# Altium footprint library andylib.PcbLib: 158 footprints (part 9 of 10)
Each footprint in its own frame and in the unit in brackets; x right, y up, seen from the top. Pads: shape width x height; smd on the part's side, far side on the other; paste and mask are expansions set on the pad; w line width, h text height; cw(c..) or ccw(c..) is an arc to the next point about the centre after c.
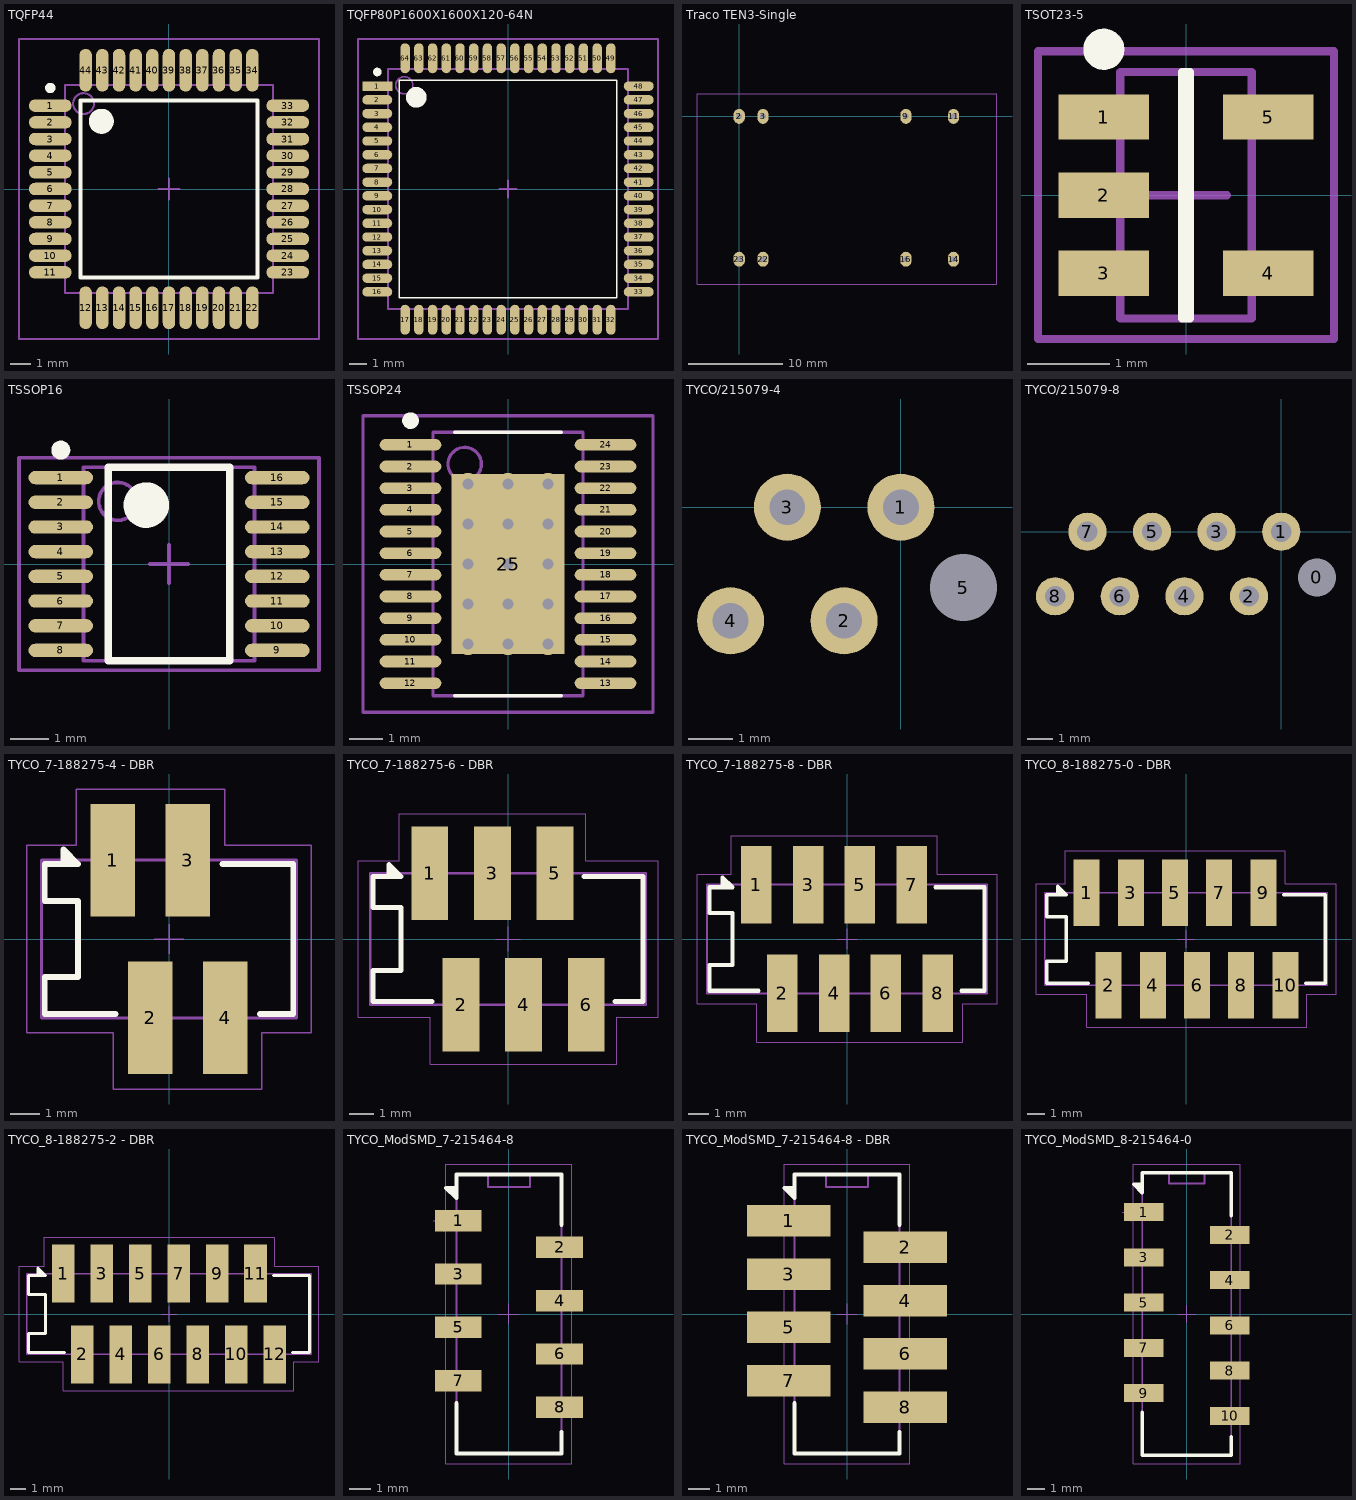
[diagram p8: the footprints below, top view; thin cyan lines are the x and y axes]

## TQFP44 [mm]
pads (44):
  oval 2.05x0.6 smd: 1(-5.7,4) 2(-5.7,3.2) 3(-5.7,2.4) 4(-5.7,1.6) 5(-5.7,0.8) 6(-5.7,0) 7(-5.7,-0.8) 8(-5.7,-1.6) 9(-5.7,-2.4) 10(-5.7,-3.2) 11(-5.7,-4) 23(5.7,-4) 24(5.7,-3.2) 25(5.7,-2.4) 26(5.7,-1.6) 27(5.7,-0.8) 28(5.7,0) 29(5.7,0.8) 30(5.7,1.6) 31(5.7,2.4) 32(5.7,3.2) 33(5.7,4)
  oval 0.6x2.05 smd: 12(-4,-5.7) 13(-3.2,-5.7) 14(-2.4,-5.7) 15(-1.6,-5.7) 16(-0.8,-5.7) 17(0,-5.7) 18(0.8,-5.7) 19(1.6,-5.7) 20(2.4,-5.7) 21(3.2,-5.7) 22(4,-5.7) 34(4,5.7) 35(3.2,5.7) 36(2.4,5.7) 37(1.6,5.7) 38(0.8,5.7) 39(0,5.7) 40(-0.8,5.7) 41(-1.6,5.7) 42(-2.4,5.7) 43(-3.2,5.7) 44(-4,5.7)
Top Overlay:
  circle w0.6: c-3.25,3.25 r0.3
  circle w0.25: c-5.7,4.85 r0.125
  lines w0.2: -4.25,-4.25 4.25,-4.25 4.25,4.25 -4.25,4.25 -4.25,-4.25
Mechanical 13:
  circle w0.1: c-4.1,4.1 r0.5
  lines w0.1: -5,-5 5,-5 5,5 -5,5 -5,-5
Mechanical 15:
  lines w0.1: -0.5,0 0.5,0 ; 0,-0.5 0,0.5 ; -7.2,-7.2 7.2,-7.2 7.2,7.2 -7.2,7.2 -7.2,-7.2
3D body: height 1.11, standoff 0, extent -6.031,-6 5.969,6

## TQFP80P1600X1600X120-64N [mm] "TQFP, 64-Leads, Body 16.3x16.3mm (max), Pitch 0.80mm, IPC Medium Density"
height 1.2
pads (64):
  rect 1.75x0.55 smd: 1(-7.625,6)
  oval 1.75x0.55 smd: 2(-7.625,5.2) 3(-7.625,4.4) 4(-7.625,3.6) 5(-7.625,2.8) 6(-7.625,2) 7(-7.625,1.2) 8(-7.625,0.4) 9(-7.625,-0.4) 10(-7.625,-1.2) 11(-7.625,-2) 12(-7.625,-2.8) 13(-7.625,-3.6) 14(-7.625,-4.4) 15(-7.625,-5.2) 16(-7.625,-6) 33(7.625,-6) 34(7.625,-5.2) 35(7.625,-4.4) 36(7.625,-3.6) 37(7.625,-2.8) 38(7.625,-2) 39(7.625,-1.2) 40(7.625,-0.4) 41(7.625,0.4) 42(7.625,1.2) 43(7.625,2) 44(7.625,2.8) 45(7.625,3.6) 46(7.625,4.4) 47(7.625,5.2) 48(7.625,6)
  oval 0.55x1.75 smd: 17(-6,-7.625) 18(-5.2,-7.625) 19(-4.4,-7.625) 20(-3.6,-7.625) 21(-2.8,-7.625) 22(-2,-7.625) 23(-1.2,-7.625) 24(-0.4,-7.625) 25(0.4,-7.625) 26(1.2,-7.625) 27(2,-7.625) 28(2.8,-7.625) 29(3.6,-7.625) 30(4.4,-7.625) 31(5.2,-7.625) 32(6,-7.625) 49(6,7.625) 50(5.2,7.625) 51(4.4,7.625) 52(3.6,7.625) 53(2.8,7.625) 54(2,7.625) 55(1.2,7.625) 56(0.4,7.625) 57(-0.4,7.625) 58(-1.2,7.625) 59(-2,7.625) 60(-2.8,7.625) 61(-3.6,7.625) 62(-4.4,7.625) 63(-5.2,7.625) 64(-6,7.625)
Top Overlay:
  circle w0.25: c-7.625,6.825 r0.125
  circle w0.6: c-5.35,5.35 r0.3
  lines w0.1: -6.35,-6.35 -6.35,6.35 6.35,6.35 6.35,-6.35 -6.35,-6.35
Mechanical 13:
  circle w0.1: c-6.05,6.05 r0.5
  lines w0.1: -7,-7 -7,7 7,7 7,-7 -7,-7
Mechanical 15:
  lines w0.1: -0.5,0 0.5,0 ; 0,-0.5 0,0.5 ; -8.75,-8.75 -8.75,8.75 8.75,8.75 8.75,-8.75 -8.75,-8.75
3D body: height 1.11, standoff 0, extent -8,-8 8,8

## Traco TEN3-Single [mm] "Traco TEN3 Single Output DC-DC"
height 10.2
pads (8):
  oval 1.2x1.6 hole 0.6 unplated: 2(0,0) 3(2.54,0) 9(17.78,0) 11(22.86,0) 14(22.86,-15.24) 16(17.78,-15.24) 22(2.54,-15.24) 23(0,-15.24)
Mechanical 13:
  lines w0.1: -4.5,-17.9 27.5,-17.9 27.5,2.4 -4.5,2.4 -4.5,-17.9
3D body: height 10.2, standoff -5, extent -5,-17.8 27,2.5

## TSOT23-5 [mm] "SOT23, 5-Leads, Body 3.0x2.6mm (max), Pitch 0.95mm, IPC Medium Density"
height 1.1
pads (5):
  rect 1.1x0.55 smd: 1(-1,0.95) 2(-1,0) 3(-1,-0.95) 4(1,-0.95) 5(1,0.95)
Top Overlay:
  circle w0.25: c-1,1.775 r0.125
  lines w0.1: -0.05,-1.5 -0.05,1.5 0.05,1.5 0.05,-1.5 -0.05,-1.5
Mechanical 13:
  lines w0.1: -0.8,-1.5 0.8,-1.5 0.8,1.5 -0.8,1.5 -0.8,-1.5
Mechanical 15:
  lines w0.1: -0.5,0 0.5,0 ; 0,-0.5 0,0.5 ; -1.8,-1.75 1.8,-1.75 1.8,1.75 -1.8,1.75 -1.8,-1.75
3D body: height 1.1, standoff 0.05, extent -0.8,-1.5 0.8,1.5
3D body: height 0.86, standoff 0, extent -1.405,-1.476 1.405,1.524

## TSSOP16 [mm] "TSOP, 16-Leads, Body 5x4.4mm, Pitch 0.65mm, IPC Medium Density"
height 1.2
pads (16):
  oval 1.7x0.35 smd: 1(-2.85,2.275) 2(-2.85,1.625) 3(-2.85,0.975) 4(-2.85,0.325) 5(-2.85,-0.325) 6(-2.85,-0.975) 7(-2.85,-1.625) 8(-2.85,-2.275) 9(2.85,-2.275) 10(2.85,-1.625) 11(2.85,-0.975) 12(2.85,-0.325) 13(2.85,0.325) 14(2.85,0.975) 15(2.85,1.625) 16(2.85,2.275)
Top Overlay:
  circle w0.25: c-2.85,3 r0.125
  circle w0.6: c-0.6,1.55 r0.3
  lines w0.2: -1.6,-2.55 -1.6,2.55 1.6,2.55 1.6,-2.55 -1.6,-2.55
Mechanical 13:
  circle w0.1: c-1.35,1.65 r0.5
  lines w0.1: -2.25,-2.55 -2.25,2.55 2.25,2.55 2.25,-2.55 -2.25,-2.55
Mechanical 15:
  lines w0.1: -0.5,0 0.5,0 ; 0,-0.5 0,0.5 ; -3.95,-2.8 -3.95,2.8 3.95,2.8 3.95,-2.8 -3.95,-2.8
3D body: height 1.25, standoff 0, extent -3.253,-2.55 3.203,2.55

## TSSOP24 [mm] "TSOP, 24-Leads, Body 7.9x4.5mm (max), Pitch 0.65mm, IPC Low Density"
height 1.2
pads (25):
  oval 1.85x0.35 smd: 1(-2.925,3.575) 2(-2.925,2.925) 3(-2.925,2.275) 4(-2.925,1.625) 5(-2.925,0.975) 6(-2.925,0.325) 7(-2.925,-0.325) 8(-2.925,-0.975) 9(-2.925,-1.625) 10(-2.925,-2.275) 11(-2.925,-2.925) 12(-2.925,-3.575) 13(2.925,-3.575) 14(2.925,-2.925) 15(2.925,-2.275) 16(2.925,-1.625) 17(2.925,-0.975) 18(2.925,-0.325) 19(2.925,0.325) 20(2.925,0.975) 21(2.925,1.625) 22(2.925,2.275) 23(2.925,2.925) 24(2.925,3.575)
  rect 3.4x5.4 smd: 25(0,0)
via -1.2,2.4 diameter 0.66 hole 0.33
via 0,2.4 diameter 0.66 hole 0.33
via 1.2,2.4 diameter 0.66 hole 0.33
via -1.2,1.2 diameter 0.66 hole 0.33
via 0,1.2 diameter 0.66 hole 0.33
via 1.2,1.2 diameter 0.66 hole 0.33
via -1.2,0 diameter 0.66 hole 0.33
via 0,0 diameter 0.66 hole 0.33
via 1.2,0 diameter 0.66 hole 0.33
via -1.2,-1.2 diameter 0.66 hole 0.33
via 0,-1.2 diameter 0.66 hole 0.33
via 1.2,-1.2 diameter 0.66 hole 0.33
via -1.2,-2.4 diameter 0.66 hole 0.33
via 0,-2.4 diameter 0.66 hole 0.33
via 1.2,-2.4 diameter 0.66 hole 0.33
Top Overlay:
  circle w0.25: c-2.925,4.3 r0.125
  lines w0.1: -1.6,-3.95 1.6,-3.95 ; -1.6,3.95 1.6,3.95
Mechanical 13:
  circle w0.1: c-1.3,3 r0.5
  lines w0.1: -2.25,-3.95 -2.25,3.95 2.25,3.95 2.25,-3.95 -2.25,-3.95
Mechanical 15:
  lines w0.1: -0.5,0 0.5,0 ; 0,-0.5 0,0.5 ; -4.35,-4.45 -4.35,4.45 4.35,4.45 4.35,-4.45 -4.35,-4.45
3D body: height 1.18, standoff 0, extent -3.2,-3.925 3.207,3.965

## TYCO/215079-4 [mm]
pads (5):
  round 1.5 hole 0.8: 1(0,0) 2(-1.27,-2.54) 3(-2.54,0) 4(-3.81,-2.54)
  round 1.3 hole 1.5 unplated: 5(1.4,-1.8)
3D body: height 4, standoff -3, extent -5.41,-3.74 1.6,1.26

## TYCO/215079-8 [mm]
pads (9):
  round 1.3 hole 1.5 unplated: 0(1.4,-1.8)
  round 1.5 hole 0.8: 1(0,0) 2(-1.27,-2.54) 3(-2.54,0) 4(-3.81,-2.54) 5(-5.08,0) 6(-6.35,-2.54) 7(-7.62,0) 8(-8.89,-2.54)
3D body: height 4, standoff -3, extent -10.49,-3.77 1.6,1.23

## TYCO_7-188275-4 - DBR [mil] "Micro-Match 4 pins Female on board Vertical Smd connector"
height 330.71
pads (4):
  rect 59x150 smd: 1(-75,105) 2(-25,-105) 3(25,105) 4(75,-105)
Top Overlay:
  lines w7.87: -140.51,100 -140.35,100.16 -140.35,119.09 -121.26,100 -165.55,100 ; -140.4,100 -129.14,100 ; -140.35,111.22 -140.35,110.11 -130.24,100 ; -71.26,-100 -165.55,-100 -165.55,-50.35 ; 71.26,100 165.55,100 165.55,-100 121.26,-100 ; -165.55,-50.35 -165.55,-50.35 ; -165.55,-50.35 -121.26,-50.35 -121.26,50.35 ; -165.55,100 -165.55,50.35 -121.26,50.35 ; -165.55,100 -165.55,100 ; -121.26,50.35 -121.26,50.35
Mechanical 13:
  lines w3.94: -86.81,105 -75,93.19 -63.19,105 ; -82.87,105 -75,97.13 -67.13,105 ; -78.94,105 -75,101.06 -71.06,105 ; -170,-105 -170,105 170,105 170,-105 -170,-105
  text ".Designator" at -32.48,-6.89 h19.68
Mechanical 15:
  lines w1.97: -94.69,105 -75,105 ; -75,85.31 -75,105 ; -75,124.69 -75,105 ; -55.31,105 -75,105 ; -19.68,0 0,0 ; 0,-19.68 0,0 ; 0,19.69 0,0 ; 19.68,0 0,0 ; -189.69,-124.69 -189.69,124.69 -123.62,124.69 -123.62,199.8 74.41,199.8 74.41,124.69 189.69,124.69 189.69,-124.69 123.62,-124.69 123.62,-199.8 -74.41,-199.8 -74.41,-124.69 -189.69,-124.69
3D body: height 206.69, standoff 0, extent -139.76,-135.83 139.76,135.83
3D body: height 332.68, standoff 1.97, extent -166.54,-98.43 166.54,98.43

## TYCO_7-188275-6 - DBR [mil] "Micro-Match 6 pins Female on board Vertical Smd connector"
height 330.71
pads (6):
  rect 59x150 smd: 1(-125,105) 2(-75,-105) 3(-25,105) 4(25,-105) 5(75,105) 6(125,-105)
Top Overlay:
  lines w7.87: -190.51,100 -190.35,100.16 -190.35,119.09 -171.26,100 -215.55,100 ; -190.4,100 -179.14,100 ; -190.35,111.22 -190.35,110.11 -180.24,100 ; -121.26,-100 -215.55,-100 -215.55,-50.35 ; 121.26,100 215.55,100 215.55,-100 171.26,-100 ; -215.55,-50.35 -171.26,-50.35 -171.26,50.35 ; -215.55,-50.35 -215.55,-50.35 ; -215.55,100 -215.55,100 ; -215.55,100 -215.55,50.35 -171.26,50.35 ; -171.26,50.35 -171.26,50.35
Mechanical 13:
  lines w3.94: -136.81,105 -125,93.19 -113.19,105 ; -132.87,105 -125,97.13 -117.13,105 ; -128.94,105 -125,101.06 -121.06,105 ; -220,-105 220,-105 220,105 -220,105 -220,-105
  text ".Designator" at -32.48,-6.89 h19.68
Mechanical 15:
  lines w1.97: -144.69,105 -125,105 ; -125,85.31 -125,105 ; -125,124.69 -125,105 ; -105.31,105 -125,105 ; -19.68,0 0,0 ; 0,-19.68 0,0 ; 0,19.69 0,0 ; 19.68,0 0,0 ; -239.69,-124.69 -124.41,-124.69 -124.41,-199.8 173.62,-199.8 173.62,-124.69 239.69,-124.69 239.69,124.69 124.41,124.69 124.41,199.8 -173.62,199.8 -173.62,124.69 -239.69,124.69 -239.69,-124.69
3D body: height 332.68, standoff 1.97, extent -216.54,-98.43 216.54,98.43
3D body: height 206.69, standoff 0, extent -187.99,-135.83 187.99,135.83

## TYCO_7-188275-8 - DBR [mil] "Micro-Match 8 pins Female on board Vertical Smd connector"
height 330.71
pads (8):
  rect 59x150 smd: 1(-175,105) 2(-125,-105) 3(-75,105) 4(-25,-105) 5(25,105) 6(75,-105) 7(125,105) 8(175,-105)
Top Overlay:
  lines w7.87: -240.51,100 -240.35,100.16 -240.35,119.09 -221.26,100 -265.55,100 ; -240.4,100 -229.14,100 ; -240.35,111.22 -240.35,110.11 -230.24,100 ; -171.26,-100 -265.55,-100 -265.55,-50.35 ; 171.26,100 265.55,100 265.55,-100 221.26,-100 ; -265.55,-50.35 -221.26,-50.35 -221.26,50.35 ; -265.55,-50.35 -265.55,-50.35 ; -265.55,100 -265.55,100 ; -265.55,100 -265.55,50.35 -221.26,50.35 ; -221.26,50.35 -221.26,50.35
Mechanical 13:
  lines w3.94: -186.81,105 -175,93.19 -163.19,105 ; -182.87,105 -175,97.13 -167.13,105 ; -178.94,105 -175,101.06 -171.06,105 ; -270,-105 270,-105 270,105 -270,105 -270,-105
  text ".Designator" at -31.5,-6.89 h19.68
Mechanical 15:
  lines w1.97: -194.69,105 -175,105 ; -175,85.31 -175,105 ; -175,124.69 -175,105 ; -155.31,105 -175,105 ; -19.68,0 0,0 ; 0,-19.68 0,0 ; 0,19.69 0,0 ; 19.68,0 0,0 ; -289.69,-124.69 -174.41,-124.69 -174.41,-199.8 223.62,-199.8 223.62,-124.69 289.69,-124.69 289.69,124.69 174.41,124.69 174.41,199.8 -223.62,199.8 -223.62,124.69 -289.69,124.69 -289.69,-124.69
3D body: height 332.68, standoff 1.97, extent -266.54,-98.43 266.54,98.43
3D body: height 206.69, standoff 0, extent -237.99,-135.83 237.99,135.83

## TYCO_8-188275-0 - DBR [mil] "Micro-Match 10 pins Female on board Vertical Smd connector"
height 330.71
pads (10):
  rect 59x150 smd: 1(-225,105) 2(-175,-105) 3(-125,105) 4(-75,-105) 5(-25,105) 6(25,-105) 7(75,105) 8(125,-105) 9(175,105) 10(225,-105)
Top Overlay:
  lines w7.87: -290.51,100 -290.35,100.16 -290.35,119.09 -271.26,100 -315.55,100 ; -290.4,100 -279.14,100 ; -290.35,111.22 -290.35,110.11 -280.24,100 ; -221.26,-100 -315.55,-100 -315.55,-50.35 ; 221.26,100 315.55,100 315.55,-100 271.26,-100 ; -315.55,-50.35 -271.26,-50.35 -271.26,50.35 ; -315.55,-50.35 -315.55,-50.35 ; -315.55,100 -315.55,100 ; -315.55,100 -315.55,50.35 -271.26,50.35 ; -271.26,50.35 -271.26,50.35
Mechanical 13:
  lines w3.94: -236.81,105 -225,93.19 -213.19,105 ; -232.87,105 -225,97.13 -217.13,105 ; -228.94,105 -225,101.06 -221.06,105 ; -320,-105 320,-105 320,105 -320,105 -320,-105
  text ".Designator" at -32.48,-6.89 h19.68
Mechanical 15:
  lines w1.97: -244.69,105 -225,105 ; -225,85.31 -225,105 ; -225,124.69 -225,105 ; -205.31,105 -225,105 ; -19.68,0 0,0 ; 0,-19.68 0,0 ; 0,19.69 0,0 ; 19.68,0 0,0 ; -339.69,-124.69 -224.41,-124.69 -224.41,-199.8 273.62,-199.8 273.62,-124.69 339.69,-124.69 339.69,124.69 224.41,124.69 224.41,199.8 -273.62,199.8 -273.62,124.69 -339.69,124.69 -339.69,-124.69
3D body: height 206.69, standoff 0, extent -287.99,-135.83 287.99,135.83
3D body: height 332.68, standoff 1.97, extent -316.54,-98.43 316.54,98.43

## TYCO_8-188275-2 - DBR [mil] "Micro-Match 12 pins Female on board Vertical Smd connector"
height 330.71
pads (12):
  rect 59x150 smd: 1(-275,105) 2(-225,-105) 3(-175,105) 4(-125,-105) 5(-75,105) 6(-25,-105) 7(25,105) 8(75,-105) 9(125,105) 10(175,-105) 11(224.69,105) 12(275,-105)
Top Overlay:
  lines w7.87: -340.51,100 -340.35,100.16 -340.35,119.09 -321.26,100 -365.55,100 ; -340.4,100 -329.14,100 ; -340.35,111.22 -340.35,110.11 -330.24,100 ; -271.26,-100 -365.55,-100 -365.55,-50.35 ; 271.26,100 365.55,100 365.55,-100 321.26,-100 ; -365.55,-50.35 -321.26,-50.35 -321.26,50.35 ; -365.55,-50.35 -365.55,-50.35 ; -365.55,100 -365.55,100 ; -365.55,100 -365.55,50.35 -321.26,50.35 ; -321.26,50.35 -321.26,50.35
Mechanical 13:
  lines w3.94: -286.81,105 -275,93.19 -263.19,105 ; -282.87,105 -275,97.13 -267.13,105 ; -278.94,105 -275,101.06 -271.06,105 ; -370,-105 370,-105 370,105 -370,105 -370,-105
  text ".Designator" at -31.5,-6.89 h19.68
Mechanical 15:
  lines w1.97: -294.69,105 -275,105 ; -275,85.31 -275,105 ; -275,124.69 -275,105 ; -255.31,105 -275,105 ; -19.68,0 0,0 ; 0,-19.68 0,0 ; 0,19.69 0,0 ; 19.68,0 0,0 ; -389.69,-124.69 -274.41,-124.69 -274.41,-199.8 323.62,-199.8 323.62,-124.69 389.69,-124.69 389.69,124.69 274.41,124.69 274.41,199.8 -323.62,199.8 -323.62,124.69 -389.69,124.69 -389.69,-124.69
3D body: height 330.71, standoff 0, extent -370,-105 370,105

## TYCO_ModSMD_7-215464-8 [mil] "Micro-Match 8 pins Male on board Vertical Truehole Modified in SMDconnector"
height 271.65
pads (8):
  rect 87.99x40 smd: 1(-95,175) 2(95,125) 3(-95,75) 4(95,25) 5(-95,-25) 6(95,-75) 7(-95,-125) 8(95,-175)
Top Overlay:
  lines w7.87: -109.65,236.61 -108.54,236.61 -98.43,226.5 ; -98.43,225.4 -98.43,236.66 ; -98.43,236.77 -98.58,236.61 -117.52,236.61 -98.43,217.52 -98.43,261.81 98.43,261.81 98.42,167.52 ; -98.42,-167.52 -98.43,-261.81 98.43,-261.81 98.43,-221.26
Mechanical 13:
  lines w3.94: -98.43,163.19 -86.61,175 -98.43,186.81 ; -98.43,167.13 -90.55,175 -98.43,182.87 ; -98.43,171.06 -94.49,175 -98.43,178.94 ; -39.37,261.81 -39.37,238.19 39.37,238.19 39.37,261.81 ; -98.43,-261.81 98.43,-261.81 98.43,261.81 -98.43,261.81 -98.43,-261.81
  text ".Designator" at 6.89,-33.46 h19.68
Mechanical 15:
  lines w1.97: -142.4,175 -122.72,175 ; -122.72,155.31 -122.72,175 ; -122.72,194.69 -122.72,175 ; -103.03,175 -122.72,175 ; -19.68,0 0,0 ; 0,-19.69 0,0 ; 0,19.69 0,0 ; 19.68,0 0,0 ; -118.11,-281.5 -118.11,281.5 118.11,281.5 118.11,-281.5 -118.11,-281.5
3D body: height 181.1, standoff 0, extent -127.95,-262.6 127.95,262.6

## TYCO_ModSMD_7-215464-8 - DBR [mm] "Micro-Match 8 pins Male on board Vertical Truehole Modified in SMDconnector"
height 6.9
pads (8):
  rect 4x1.499 smd: 1(-2.775,4.445) 2(2.775,3.175) 3(-2.775,1.905) 4(2.775,0.635) 5(-2.775,-0.635) 6(2.775,-1.905) 7(-2.775,-3.175) 8(2.775,-4.445)
Top Overlay:
  lines w0.2: -2.785,6.01 -2.757,6.01 -2.5,5.753 ; -2.5,5.725 -2.5,6.011 ; -2.5,6.014 -2.504,6.01 -2.985,6.01 -2.5,5.525 -2.5,6.65 2.5,6.65 2.5,4.255 ; -2.5,-4.255 -2.5,-6.65 2.5,-6.65 2.5,-5.62
Mechanical 13:
  lines w0.1: -2.5,4.145 -2.2,4.445 -2.5,4.745 ; -2.5,4.245 -2.3,4.445 -2.5,4.645 ; -2.5,4.345 -2.4,4.445 -2.5,4.545 ; -1,6.65 -1,6.05 1,6.05 1,6.65 ; -2.5,-6.65 2.5,-6.65 2.5,6.65 -2.5,6.65 -2.5,-6.65
  text ".Designator" at 0.175,-0.85 h0.5
Mechanical 15:
  lines w0.05: -3.617,4.445 -3.117,4.445 ; -3.117,3.945 -3.117,4.445 ; -3.117,4.945 -3.117,4.445 ; -2.617,4.445 -3.117,4.445 ; -0.5,0 0,0 ; 0,-0.5 0,0 ; 0,0.5 0,0 ; 0.5,0 0,0 ; -3,-7.15 -3,7.15 3,7.15 3,-7.15 -3,-7.15
3D body: height 3.8, standoff 0, extent -2.5,-6.65 2.5,6.65
3D body: height 6.9, standoff 0, extent -1,6.05 1,6.65

## TYCO_ModSMD_8-215464-0 [mil] "Micro-Match 10 pins Male on board Vertical Truehole Modified in SMDconnector"
height 271.65
pads (10):
  rect 87.99x40 smd: 1(-95,225) 2(95,175) 3(-95,125) 4(95,75) 5(-95,25) 6(95,-25) 7(-95,-75) 8(95,-125) 9(-95,-175) 10(95,-225)
Top Overlay:
  lines w7.87: -109.65,286.61 -108.54,286.61 -98.43,276.5 ; -98.43,275.4 -98.43,286.66 ; -98.43,286.77 -98.58,286.61 -117.52,286.61 -98.43,267.52 -98.43,311.81 98.43,311.81 98.42,217.52 ; -98.42,-217.52 -98.43,-311.81 98.43,-311.81 98.43,-271.26
Mechanical 13:
  lines w3.94: -98.43,213.19 -86.61,225 -98.43,236.81 ; -98.43,217.13 -90.55,225 -98.43,232.87 ; -98.43,221.06 -94.49,225 -98.43,228.94 ; -39.37,311.81 -39.37,288.19 39.37,288.19 39.37,311.81 ; -98.43,-311.81 98.43,-311.81 98.43,311.81 -98.43,311.81 -98.43,-311.81
  text ".Designator" at 6.89,16.54 h19.68
Mechanical 15:
  lines w1.97: -142.4,225 -122.72,225 ; -122.72,205.31 -122.72,225 ; -122.72,244.69 -122.72,225 ; -103.03,225 -122.72,225 ; -19.68,0 0,0 ; 0,-19.69 0,0 ; 0,19.69 0,0 ; 19.68,0 0,0 ; -118.11,-331.5 -118.11,331.5 118.11,331.5 118.11,-331.5 -118.11,-331.5
3D body: height 181.1, standoff 0, extent -127.95,-312.6 127.95,312.6